# Altium footprint library Electronic Devices_LIB.PcbLib: 410 footprints (part 7 of 26)
Each footprint in its own frame and in the unit in brackets; x right, y up, seen from the top. Pads: shape width x height; smd on the part's side, far side on the other; paste and mask are expansions set on the pad; w line width, h text height; cw(c..) or ccw(c..) is an arc to the next point about the centre after c.
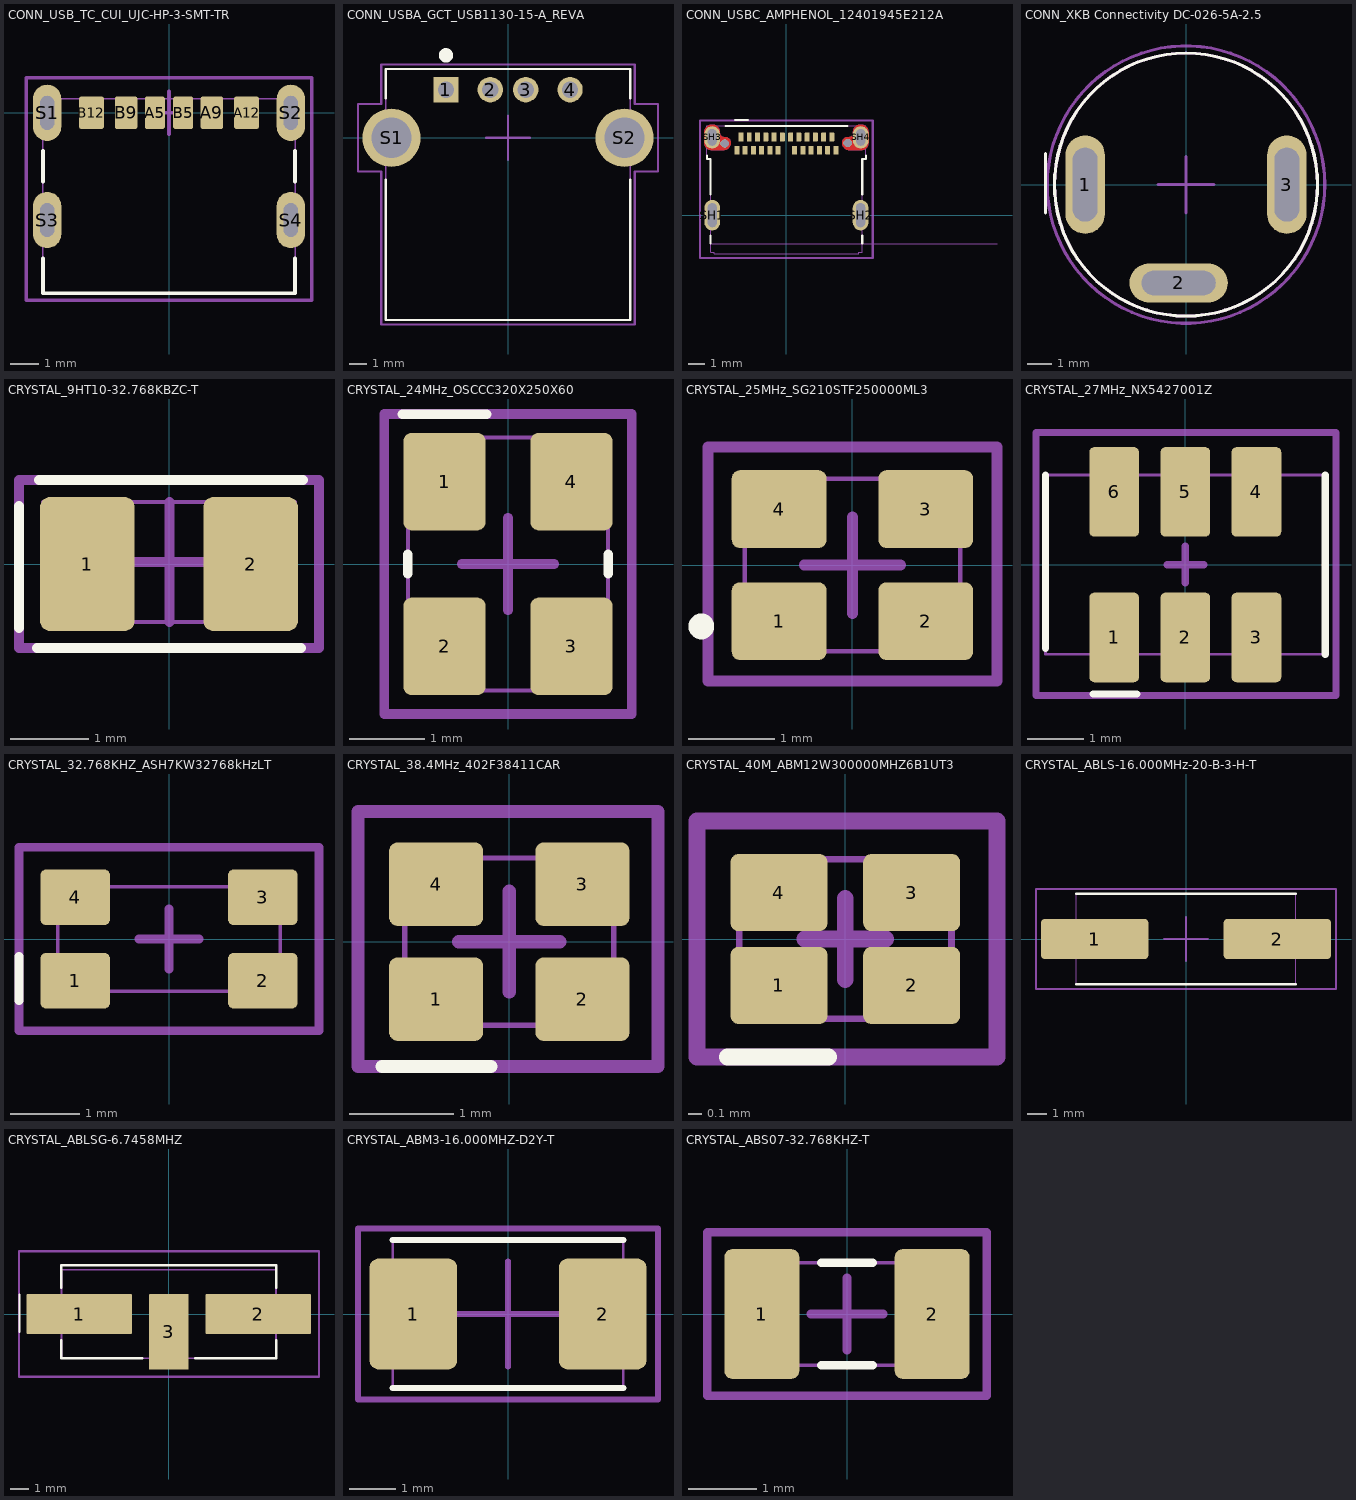
[diagram p6: the footprints below, top view; thin cyan lines are the x and y axes]

## CONN_USB_TC_CUI_UJC-HP-3-SMT-TR [mm] "Receptacle Connector 24 (6+18 Dummy) Position Surface Mount, Right Angle; Through Hole"
height 3.16
pads (10):
  rrect20% 0.7x1.15 smd: A5(-0.5,0.005) B5(0.5,0.005)
  rrect20% 0.8x1.15 smd: A9(1.52,0.005) B9(-1.52,0.005)
  rrect20% 0.9x1.15 smd: A12(2.75,0.005) B12(-2.75,0.005)
  oval 1x2 hole 0.5 slot 1.2 at 90 deg: S1(-4.32,0) S2(4.32,0) S3(-4.32,-3.8) S4(4.32,-3.8)
Top Overlay:
  lines w0.127: -4.47,-5.15 -4.47,-6.4 4.47,-6.4 4.47,-5.15 ; -4.47,-2.45 -4.47,-1.35 ; 4.47,-2.45 4.47,-1.35
Top Assembly:
  lines w0.051: -4.47,-6.4 -4.47,0.5 4.47,0.5 4.47,-6.4 -4.47,-6.4
  text ".Designator" at -2.591,-2.955 h0.51
Top Courtyard:
  lines w0.127: -0.762,0 0,0 ; 0,-0.762 0,0 ; 0,0.762 0,0 ; 0.762,0 0,0 ; -5.07,-6.65 -5.07,1.25 5.07,1.25 5.07,-6.65 -5.07,-6.65
3D body "UJC-HP-3-SMT-TR--3DModel-STEP-56544.STEP": height 3.27, standoff -0.99, extent -4.445,-6.35 4.495,0.55

## CONN_USBA_GCT_USB1130-15-A_REVA [mm]
height 7.24
pads (6):
  rect 1.428x1.428 / inner round 1.428 / far side rect 1.428x1.428 hole 0.92: 1(-3.5,2.71)
  round 1.428 hole 0.92: 2(-1,2.71) 3(1,2.71) 4(3.5,2.71)
  round 3.276 hole 2.26: S1(-6.57,0) S2(6.57,0)
Top Overlay:
  circle w0.6: c-3.5,4.65 r0.1
  lines w0.127: -6.9,-2.37 -6.9,-10.28 6.9,-10.28 6.9,-2.37 ; -6.9,2.22 -6.9,3.88 6.9,3.88 6.9,2.22
Top Assembly:
  circle w0.2: c-3.531,2.845 r0.1
  lines w0.1: -6.9,-10.28 -6.9,3.88 6.9,3.88 6.9,-10.28 -6.9,-10.28
  text ".Designator" at -2.349,-0.38 h0.51
Top Courtyard:
  lines w0.127: -1.245,0 0,0 ; 0,-1.245 0,0 ; 0,1.245 0,0 ; 1.245,0 0,0 ; -8.46,-1.9 -7.15,-1.9 -7.15,-10.53 7.15,-10.53 7.15,-1.9 8.46,-1.9 8.46,1.9 7.15,1.9 7.15,4.13 -7.15,4.13 -7.15,1.9 -8.46,1.9 -8.46,-1.9
3D body "step_temp.STEP": height 6.99, standoff -3.22, extent -7.799,-10.28 7.799,3.88

## CONN_USBC_AMPHENOL_12401945E212A [mm] "TYPE C 24P"
height 3.51
pads (28):
  rrect20% 0.3x0.53 smd: A1(-2.75,4.73) A2(-2.25,4.73) A3(-1.75,4.73) A4(-1.25,4.73) A5(-0.75,4.73) A6(-0.25,4.73) A7(0.25,4.73) A8(0.75,4.73) A9(1.25,4.73) A10(1.75,4.73) A11(2.25,4.73) A12(2.75,4.73) B1(3,3.93) B2(2.5,3.93) B3(2,3.93) B4(1.5,3.93) B5(1,3.93) B6(0.5,3.93) B7(-0.5,3.93) B8(-1,3.93) B9(-1.5,3.93) B10(-2,3.93) B11(-2.5,3.93) B12(-3,3.93)
  oval 0.95x1.85 hole 0.55 slot 1.45 at 90 deg: SH1(-4.49,0) SH2(4.49,0)
  oval 0.95x1.35 hole 0.55 slot 1 at 90 deg mask+0: SH3(-4.5,4.71) SH4(4.5,4.71)
via -3.734,4.343 diameter 0.5 hole 0.5
via 3.708,4.369 diameter 0.5 hole 0.5
Top Layer:
  region: 182 vertices and 0 holes, not listed, extent 3.37,3.935 4.975,5.485
  region: 182 vertices and 0 holes, not listed, extent -4.975,3.935 -3.37,5.485
Bottom Layer:
  region: 182 vertices and 0 holes, not listed, extent 3.37,3.935 4.975,5.485
  region: 182 vertices and 0 holes, not listed, extent -4.975,3.935 -3.37,5.485
Top Overlay:
  lines w0.127: -4.81,3.62 -4.81,3.4 -4.59,3.4 -4.59,1.25 ; -4.59,-1.72 -4.59,-1.25 ; -3.7,5.4 3.7,5.4 ; -3.124,5.766 -2.337,5.766 ; 4.59,-1.72 4.59,-1.25 ; 4.59,1.25 4.59,3.4 4.81,3.4 4.81,3.62
Top Solder:
  drawing of 2 lines, arcs and shapes, not listed
Bottom Solder:
  drawing of 2 lines, arcs and shapes, not listed
Mechanical 1:
  lines w0: -4.775,4.385 ccw(c-4.525,4.385) -4.525,4.135 -3.715,4.135 ccw(c-3.715,4.38) -3.47,4.38 ccw(c-3.715,4.38) -3.715,4.625 -3.975,4.625 cw(c-3.975,4.875) -4.225,4.875 -4.225,5.01 ccw(c-4.5,5.01) -4.5,5.285 ccw(c-4.5,5.01) -4.775,5.01 -4.775,4.385 ; 3.47,4.38 ccw(c3.715,4.38) 3.715,4.135 4.525,4.135 ccw(c4.525,4.385) 4.775,4.385 4.775,5.01 ccw(c4.5,5.01) 4.5,5.285 ccw(c4.5,5.01) 4.225,5.01 4.225,4.875 cw(c3.975,4.875) 3.975,4.625 3.715,4.625 ccw(c3.715,4.38) 3.47,4.38
Top Assembly:
  lines w0.051: 12.75,-1.72 -4.59,-1.72 ; -4.59,-1.72 -4.59,3.4 -4.81,3.4 -4.81,5.4 4.81,5.4 4.81,3.4 4.59,3.4 4.59,-2.25 4.37,-2.25 4.37,-2.35 -4.37,-2.35 -4.37,-2.25 -4.59,-2.25 -4.59,-1.72
  text "PCB EDGE" at 5.5,-1.5 h1
  text ".Designator" at -2.311,0.855 h0.51
Top Courtyard:
  lines w0.127: -5.225,-2.6 -5.225,5.735 5.225,5.735 5.225,-2.6 -5.225,-2.6
3D body "12401945E212A.step": height 3.2, standoff -0.87, extent -4.81,-2.362 4.81,5.388

## CONN_XKB Connectivity DC-026-5A-2.5 [mm] "Straight DC Power Receptacle 260? Brass -20?~+70? 2.5mm 5.6mm 5A 24V Plugin AC/DC Power Connectors ROHS"
height 22.6
pads (3):
  oval 1.6x4 hole 1 slot 3 at 90 deg: 1(-4.1,0) 3(4.1,0)
  oval 4x1.6 hole 1 slot 3 at 0 deg: 2(-0.3,-4)
Top Overlay:
  circle w0.127: c0,0 r5.35
  lines w0.127: -5.715,-1.143 -5.715,1.27
Top Assembly:
  circle w0.127: c0,0 r5.35
  circle w0.127: c-4.1,0 r0.284
  text ".Designator" at -2.489,-0.161 h0.51
Top Courtyard:
  circle w0.127: c0,0 r5.641
  lines w0.127: -1.143,0 0,0 ; 0,-1.143 0,0 ; 0,1.143 0,0 ; 1.143,0 0,0
3D body "dc-026-5a-2_5.stp": height 16.1, standoff -5.5, extent -5.707,-5.428 5.098,5.377

## CPU_MODEL [mm]
3D body "MNG CPU_V1.0 RevA(Variant of MNG CPU_V1.0 RevA).step": height 1.48, standoff -3.09, extent 0,0 65,49

## CRYSTAL_9HT10-32.768KBZC-T [mm] "0.126\" L x 0.059\" W (3.20mm x 1.50mm)"
height 0.85
pads (2):
  rrect20% 1.2x1.7 smd: 1(-1.037,0) 2(1.038,0)
Top Overlay:
  lines w0.127: -1.905,-0.813 -1.905,0.737 ; -1.676,-1.067 1.676,-1.067 ; -1.651,1.067 1.702,1.067
Top Assembly:
  lines w0.051: -1.6,-0.737 -1.6,0.787 1.6,0.787 1.6,-0.737 -1.6,-0.737
  text ".Designator" at -2.565,-0.136 h0.51
Top Courtyard:
  lines w0.127: -0.758,0.025 0.004,0.025 ; 0.004,-0.737 0.004,0.025 ; 0.004,0.787 0.004,0.025 ; 0.766,0.025 0.004,0.025 ; -1.905,-1.067 1.905,-1.067 1.905,1.067 -1.905,1.067 -1.905,-1.067
3D body "9HT10-32.768KBZC-T.STEP": height 0.86, standoff 0.01, extent -1.6,-0.75 1.6,0.75

## CRYSTAL_24MHz_OSCCC320X250X60 [mm] "0.126\" L x 0.098\" W (3.20mm x 2.50mm)"
height 0.6
pads (4):
  rrect20% 1.09x1.29 smd: 1(-0.84,1.09) 2(-0.84,-1.09) 3(0.84,-1.09) 4(0.84,1.09)
Top Overlay:
  lines w0.127: -1.397,1.981 -0.279,1.981 ; -1.325,-0.132 -1.325,0.132 ; 1.325,-0.132 1.325,0.132
Top Assembly:
  lines w0.051: -1.325,-1.675 1.325,-1.675 1.325,1.675 -1.325,1.675 -1.325,-1.675
  text ".Designator" at -2.362,-0.136 h0.51
Top Courtyard:
  lines w0.127: -0.61,0 0,0 ; 0,-0.61 0,0 ; 0,0.61 0,0 ; 0.61,0 0,0 ; -1.635,-1.985 1.635,-1.985 1.635,1.985 -1.635,1.985 -1.635,-1.985
3D body "TSX-322524.0000MF15X-AC3.step": height 0.61, standoff 0.01, extent -1.25,-1.6 1.25,1.6

## CRYSTAL_25MHz_SG210STF250000ML3 [mm]
pads (4):
  rrect20% 1.1x0.9 smd: 1(-0.85,-0.65) 2(0.85,-0.65) 3(0.85,0.65) 4(-0.85,0.65)
Top Overlay:
  lines w0.2: -1.803,-0.711 ccw(c-1.753,-0.711) -1.703,-0.711 ; -1.803,-0.711 cw(c-1.753,-0.711) -1.703,-0.711 ; -1.803,-0.711 ccw(c-1.753,-0.711) -1.703,-0.711
Top Assembly:
  lines w0.051: -1.25,-1 1.25,-1 1.25,1 -1.25,1 -1.25,-1
  text ".Designator" at -2.515,-0.161 h0.51
Top Courtyard:
  lines w0.127: -0.559,0 0,0 ; 0,-0.559 0,0 ; 0,0.559 0,0 ; 0.559,0 0,0 ; -1.676,-1.346 1.676,-1.346 1.676,1.372 -1.676,1.372 -1.676,-1.346
3D body "SG-210STF_25.0000ML3.stp": height 1, standoff 0, extent -1.31,-1.01 1.31,1.01

## CRYSTAL_27MHz_NX5427001Z [mm] "0.197\" L x 0.126\" W (5.00mm x 3.20mm)"
height 1.35
pads (6):
  rrect20% 0.89x1.6 smd: 1(-1.27,-1.3) 2(0,-1.3) 3(1.27,-1.3) 4(1.27,1.3) 5(0,1.3) 6(-1.27,1.3)
Top Overlay:
  lines w0.127: -2.5,-1.5 -2.5,1.6 ; -1.651,-2.311 -0.864,-2.311 ; 2.5,-1.6 2.5,1.6
Top Assembly:
  lines w0.051: -2.5,-1.6 2.5,-1.6 2.5,1.6 -2.5,1.6 -2.5,-1.6
  text ".Designator" at -2.718,-0.11 h0.51
Top Courtyard:
  lines w0.127: -0.33,0 0,0 ; 0,-0.33 0,0 ; 0,0.33 0,0 ; 0.33,0 0,0 ; -2.667,-2.337 2.692,-2.337 2.692,2.362 -2.667,2.362 -2.667,-2.337
3D body "NX5427001Z.stp": height 1.45, standoff 0, extent -2.5,-2.011 2.5,2.011

## CRYSTAL_32.768KHZ_ASH7KW32768kHzLT [mm] "0.126\" L x 0.059\" W (3.20mm x 1.50mm)"
height 1
pads (4):
  rrect20% 1x0.8 smd: 1(-1.35,-0.6) 2(1.35,-0.6) 3(1.35,0.6) 4(-1.35,0.6)
Top Overlay:
  lines w0.127: -2.159,-0.889 -2.159,-0.254
Top Assembly:
  lines w0.051: -1.6,-0.75 1.6,-0.75 1.6,0.75 -1.6,0.75 -1.6,-0.75
  text ".Designator" at -2.565,-0.161 h0.51
Top Courtyard:
  lines w0.127: -0.432,0 0,0 ; 0,-0.432 0,0 ; 0,0.432 0,0 ; 0.432,0 0,0 ; -2.159,-1.321 -2.159,1.321 2.159,1.321 2.159,-1.321 -2.159,-1.321
3D body "ASH7KW-32.768KHZ-L-T.stp": height 1.1, standoff 0, extent -1.77,-0.92 1.77,0.92

## CRYSTAL_38.4MHz_402F38411CAR [mm] "0.079\" L x 0.063\" W (2.00mm x 1.60mm)"
height 0.55
pads (4):
  rrect20% 0.9x0.8 smd: 1(-0.7,-0.55) 2(0.7,-0.55) 3(0.7,0.55) 4(-0.7,0.55)
Top Overlay:
  lines w0.127: -1.219,-1.194 -0.178,-1.194
Top Assembly:
  lines w0.051: -1,-0.8 -1,0.8 1,0.8 1,-0.8 -1,-0.8
  text ".Designator" at -2.667,-0.161 h0.51
Top Courtyard:
  lines w0.127: -0.483,0 0,0 ; 0,-0.483 0,0 ; 0,0.483 0,0 ; 0.483,0 0,0 ; -1.448,-1.194 -1.448,1.245 1.422,1.245 1.422,-1.194 -1.448,-1.194
3D body "402F38411CAR.stp": height 0.65, standoff 0, extent -1.07,-0.87 1.07,0.87

## CRYSTAL_40M_ABM12W300000MHZ6B1UT3 [mm] "0.063\" L x 0.047\" W (1.60mm x 1.20mm)"
height 0.4
pads (4):
  rrect20% 0.73x0.58 smd: 1(-0.5,-0.35) 2(0.5,-0.35) 3(0.5,0.35) 4(-0.5,0.35)
Top Overlay:
  lines w0.127: -0.889,-0.889 -0.127,-0.889
Top Assembly:
  lines w0.051: -0.8,-0.6 -0.8,0.6 0.8,0.6 0.8,-0.6 -0.8,-0.6
  text ".Designator" at -2.464,-0.161 h0.51
Top Courtyard:
  lines w0.127: -0.305,0 0,0 ; 0,-0.305 0,0 ; 0,0.305 0,0 ; 0.305,0 0,0 ; -1.118,-0.889 -1.118,0.889 1.143,0.889 1.143,-0.889 -1.118,-0.889
3D body "ABM12W-40.0000MHZ-6-B1U-T3--3DModel-STEP-400430.STEP": height 0.41, standoff 0.01, extent -0.8,-0.6 0.8,0.6

## CRYSTAL_ABLS-16.000MHz-20-B-3-H-T [mm]
height 4.2
pads (2):
  rrect20% 5.6x2.1 smd: 1(-4.75,0) 2(4.75,0)
Top Overlay:
  lines w0.127: -5.7,-2.35 5.7,-2.35 ; -5.7,2.35 5.7,2.35
Top Assembly:
  lines w0.051: -5.7,-2.35 5.7,-2.35 5.7,2.35 -5.7,2.35 -5.7,-2.35
  text ".Designator" at -2.616,-0.161 h0.51
Top Courtyard:
  lines w0.127: -1.143,0 0,0 ; 0,-1.143 0,0 ; 0,1.143 0,0 ; 1.143,0 0,0 ; -7.8,-2.6 7.8,-2.6 7.8,2.6 -7.8,2.6 -7.8,-2.6
3D body "step_temp.STEP": height 4.16, standoff 0, extent -6.35,-2.349 6.35,2.349

## CRYSTAL_ABLSG-6.7458MHZ [mm] "0.449\" L x 0.185\" W (11.40mm x 4.70mm)"
height 4.2
pads (3):
  rrect2% 5.6x2.1 smd: 1(-4.75,0) 2(4.75,0)
  rrect2% 2.1x4 smd: 3(0,-0.95)
Top Overlay:
  lines w0.127: -7.925,-0.94 -7.925,1.016 ; -5.7,-1.4 -5.7,-2.35 -1.4,-2.35 ; -5.7,1.4 -5.7,2.591 5.7,2.591 5.7,1.4 ; 1.4,-2.35 5.7,-2.35 5.7,-1.4
Top Assembly:
  lines w0.1: -5.7,-2.35 5.7,-2.35 5.7,2.35 -5.7,2.35 -5.7,-2.35
  text ".Designator" at -2.388,-0.085 h0.51
Top Courtyard:
  lines w0.127: -7.95,-3.327 7.976,-3.327 7.976,3.327 -7.95,3.327 -7.95,-3.327
3D body "ABLSG-6.7458MHZ-D-2-Y-T--3DModel-STEP-400430.STEP": height 4.18, standoff 0.01, extent -6.299,-2.848 6.401,2.502

## CRYSTAL_ABM3-16.000MHZ-D2Y-T [mm]
height 1.3
pads (2):
  rrect20% 1.9x2.4 smd: 1(-2.05,0) 2(2.05,0)
Top Overlay:
  lines w0.127: -2.5,-1.6 2.5,-1.6 ; -2.5,1.6 2.5,1.6
Top Assembly:
  lines w0.051: -2.5,-1.6 2.5,-1.6 2.5,1.6 -2.5,1.6 -2.5,-1.6
  text ".Designator" at -2.489,-0.161 h0.51
Top Courtyard:
  lines w0.127: -1.143,0 0,0 ; 0,-1.143 0,0 ; 0,1.143 0,0 ; 1.143,0 0,0 ; -3.25,-1.85 3.25,-1.85 3.25,1.85 -3.25,1.85 -3.25,-1.85
3D body "ABM3-16.000MHZ-D2Y-T.stp": height 1.4, standoff 0, extent -2.81,-1.6 2.81,1.6

## CRYSTAL_ABS07-32.768KHZ-T [mm] "0.126\" L x 0.059\" W (3.20mm x 1.50mm)"
height 0.9
pads (2):
  rrect20% 1.1x1.9 smd: 1(-1.25,0) 2(1.25,0)
Top Overlay:
  lines w0.127: -0.38,-0.75 0.38,-0.75 ; -0.38,0.75 0.38,0.75
Top Assembly:
  lines w0.051: -1.6,-0.75 -1.6,0.75 1.6,0.75 1.6,-0.75 -1.6,-0.75
  text ".Designator" at -2.464,-0.136 h0.51
Top Courtyard:
  lines w0.127: -0.533,0 0,0 ; 0,-0.533 0,0 ; 0,0.533 0,0 ; 0.533,0 0,0 ; -2.05,-1.2 -2.05,1.2 2.05,1.2 2.05,-1.2 -2.05,-1.2
3D body "step_temp.STEP": height 0.89, standoff 0, extent -1.6,-0.749 1.6,0.749